# Altium footprint library mastermind.PCBLIB: 1061 footprints (part 9 of 67)
Each footprint in its own frame and in the unit in brackets; x right, y up, seen from the top. Pads: shape width x height; smd on the part's side, far side on the other; paste and mask are expansions set on the pad; w line width, h text height; cw(c..) or ccw(c..) is an arc to the next point about the centre after c.
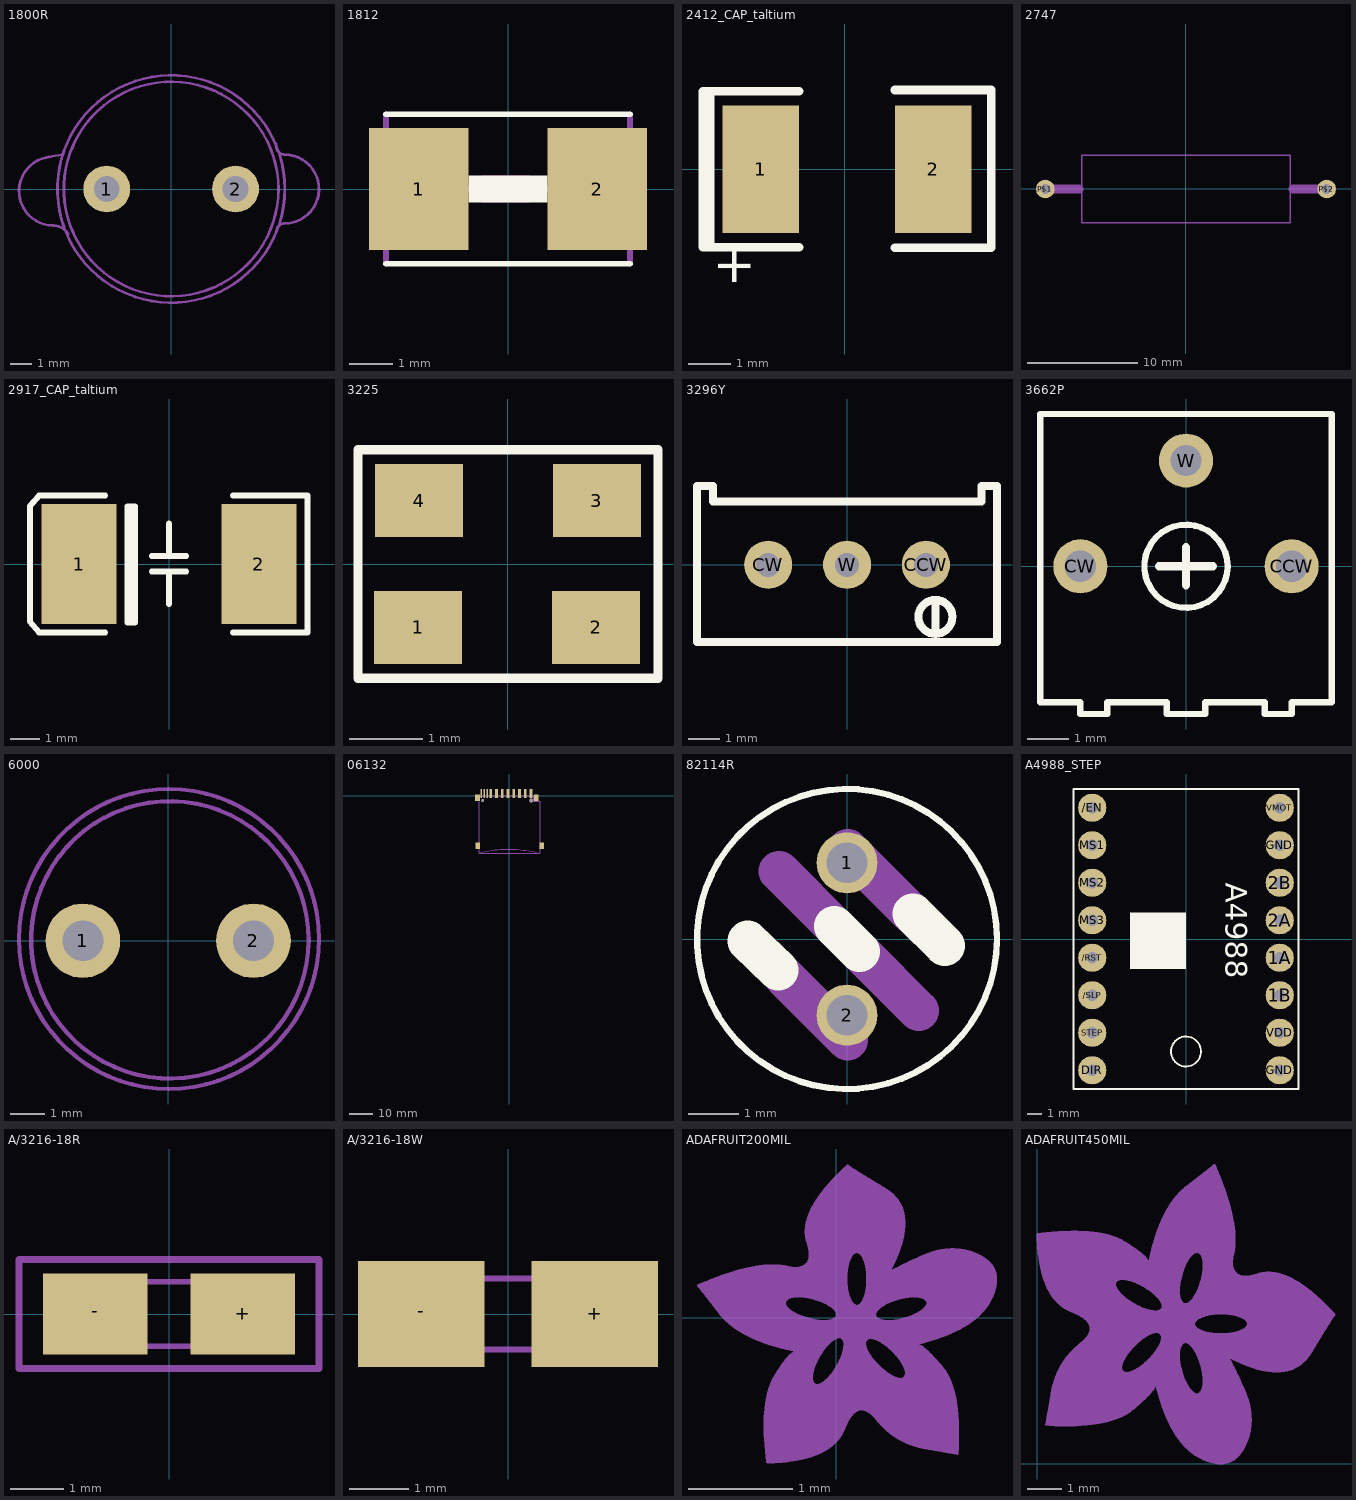
[diagram p8: the footprints below, top view; thin cyan lines are the x and y axes]

## 1800R [mil]
pads (2):
  round 86 hole 47.24: 1(-118.11,0) 2(118.11,0)
Mechanical 2:
  circle w5: c0,0 r196.85
  circle w5: c0,0 r208.66
  lines w5: -224.41,59.06 -200.79,62.99 ; -220.47,59.06 ccw(c-216.08,-3.86) -216.54,-66.93 cw(c-216.9,-99.55) -188.98,-82.68 ; 192.91,-78.74 cw(c208.66,-78.74) 208.66,-62.99 216.54,-62.99 ; 192.91,82.68 ccw(c208.78,79.23) 208.66,62.99 cw(c208.2,-0.08) 212.6,-62.99

## 1812 [mil]
pads (2):
  rect 90x110 smd: 1(-80.55,0) 2(80.55,0)
Top Overlay:
  region: -35.43,-11.81 -35.43,11.81 35.43,11.81 35.43,-11.81
  lines w5: -110.25,-67.37 110.25,-67.37 ; -110.25,67.37 110.25,67.37
Mechanical 2:
  region: -23.62,-11.81 -23.62,11.81 19.69,11.81 19.69,-11.81
Mechanical 8:
  lines w2.76: -62.99,-31.5 -62.99,31.5 ; 62.99,-31.5 62.99,31.5
  lines w5: -110.25,-67.37 -110.25,67.37 ; -90.55,0 94.49,0 ; -66.93,0 66.93,0 ; 110.25,-67.37 110.25,67.37

## 2412_CAP_taltium [mm]
pads (2):
  rect 1.8x3 smd: 1(-1.98,0) 2(2.08,0)
Top Overlay:
  region: -3.339,1.861 -3.339,-1.839 -3.079,-1.839 -3.079,1.861
  lines w0.203: -1.08,-1.829 -3.339,-1.829 -3.339,1.841 -1.08,1.841 ; 1.18,-1.841 3.443,-1.841 3.443,1.867 1.18,1.867
  text "+" at -2.22,-2.79 h0.89

## 2747 [mil]
pads (2):
  round 66 hole 35.43: P$1(-500,0) P$2(500,0)
Mechanical 2:
  lines w5: -370,-120 -370,120 370,120 370,-120 -370,-120
  lines w32: -490,0 -380,0 ; 380,0 490,0

## 2917_CAP_taltium [mil]
pads (2):
  rect 100x160 smd: 1(-120,0) 2(120,0)
Top Overlay:
  lines w7.87: -185.5,-76.85 -173.13,-91.5 -85,-91.5 ; -185.5,77 -173.13,91.5 -85,91.5 ; -55.5,-59.98 -55.5,77 -45.5,77 -45.5,71.5 -50.5,71.5 ; -55.5,-51.98 -55.5,-78 -45.5,-78 ; -23,-10 23,-10 ; -23,10.5 23,10.5 ; 0,-53.5 0,-10 ; 0,10.5 0,54
  lines w8: -185.5,-76.85 -185.5,77 ; -55.5,-76 -55.5,71 ; -52.2,-78 -45.5,-71.3 ; -52.2,-76.8 -52.2,76.8 ; -45.5,-78 -45.5,71.5 ; 85.5,-91.5 185,-91.5 185,91.5 85.5,91.5
3D body "tantalum 330uF.stp": height 110.28, standoff -3.94, extent -147.14,-84 148.14,85.29

## 3225 [mm]
pads (4):
  rect 1.2x1 smd: 1(-1.223,-0.867) 2(1.21,-0.867) 3(1.223,0.867) 4(-1.21,0.867)
Top Overlay:
  lines w0.127: -2.045,-1.562 -2.045,1.562 2.057,1.562 2.057,-1.562 -2.045,-1.562
3D body "3225-CRYSTAL.step": height 0.61, standoff 0, extent -1.6,-1.25 1.6,1.25

## 3296Y [mil] "Multi-Turn Potentiometer"
pads (3):
  round 60 hole 30: CCW(98.42,0) CW(-98.42,0) W(0,0)
Top Overlay:
  lines w10: -187.22,-96.46 -187.22,96.46 -187.22,98.43 -167.52,98.43 -167.52,78.74 167.52,78.74 167.52,98.43 187.01,98.43 187.01,96.46 187.01,-96.46 -187.01,-96.46 ; 109.99,-86.2 cw(c110.19,-64.99) 110.4,-86.2 ; 110.39,-50 110.39,-65 ; 110.39,-65 110.39,-80 110.39,-65
3D body "Trimpot_3296W.STEP": height 454.72, standoff -102.36, extent -187.6,-95.08 187.6,95.08

## 3662P [mm] "Single Turn/Trimming Potentiometer"
pads (3):
  round 1.3 hole 0.75: CCW(2.54,0) CW(-2.54,0) W(0,2.54)
Top Overlay:
  circle w0.152: c0,0 r1
  lines w0.152: -3.5,-3.271 -3.5,3.66 3.5,3.66 3.5,-3.271 2.54,-3.271 2.54,-3.551 1.89,-3.551 1.89,-3.271 0.46,-3.271 0.46,-3.551 -0.46,-3.551 -0.46,-3.271 -1.89,-3.271 -1.89,-3.551 -2.54,-3.551 -2.54,-3.271 -3.5,-3.271
  lines w0.2: -0.65,0 0,0 ; 0,-0.46 0,0 ; 0,0.46 0,0 ; 0.65,0 0,0
3D body "10K,  BOURNS 3362P-103LF.STEP": height 4.75, standoff -3.1, extent -3.33,-3.551 3.33,3.439

## 6000 [mil]
pads (2):
  round 86 hole 47.24: 1(-98.43,0) 2(98.43,0)
Mechanical 2:
  circle w5: c1,2 r173
  circle w5: c2,1 r160

## 06132 [mm]
pads (17):
  round 1.1 hole 1.1: 1(-11.6,-2.1)
  rect 1.2x4 smd: 1(6.9,0.9) 2(4.4,0.9) 3(1.9,0.9) 4(-0.6,0.9) 5(-3.1,0.9) 6(-5.6,0.9) 7(-8.1,0.9) 9(9.4,0.9)
  round 1.6 hole 1.6: 1(9.5,-2.1)
  rect 0.7x4 smd: 8(-9.7,0.9) CD(-11,0.9) WP(-12.2,0.9)
  rect 2x2.8 smd: GP(-13.8,-21.8) GP2(14.1,-21.8) GP3(11.7,-0.9) GP4(-13.9,-1)
Mechanical 2:
  lines w0.127: -12.3,-25.1 -12.4,-24.8 cw(c-0.615,-75.53) 12,-25 12.2,-25.1 ; -12.3,-25.1 -13.2,-25.1 -13.2,0 10.6,0 10.6,-2.5 13.2,-2.5 13.3,-25.1 12.2,-25.1 ; -12.3,-25.1 12.2,-25.1

## 82114R [mil]
pads (2):
  oval 47.99x48 hole 32: 1(0,60) 2(0,-60)
Top Overlay:
  circle w5: c0,0 r118.11
  lines w32: -78.15,-1.57 -54.13,-24.61 ; -10.16,10.16 9.84,-9.84 ; 51.98,19.74 76.98,-5.26
Mechanical 2:
  lines w32: -53.52,53.45 -8.52,8.45 ; -49.5,-29.5 0.5,-79.5 ; 0.5,70.5 50.5,20.5 ; 11.48,-11.55 56.48,-56.55
3D body "inductor_PCB.STEP": height 340.25, standoff -92.82, extent -174.36,-175.27 182.85,182.12

## A4988_STEP [mil]
pads (16):
  round 75 / inner round 60 / far side round 75 hole 31.5: 1A(250,-50) 1B(250,-150) 2A(250,50) 2B(250,150) /EN(-250,350) /RST(-250,-50) /SLP(-250,-150) DIR(-250,-350) GND(250,-350) GND(250,250) MS1(-250,250) MS2(-250,150) MS3(-250,50) STEP(-250,-250) VDD(250,-250) VMOT(250,350)
Top Overlay:
  circle w5: c0,-300 r40
  rectangle: -149.98,-80 0.02,70
  lines w5: -300,-400 300,-400 300,400 -300,400 -300,-400
  text "A4988" at 86.61,150 h98.43
3D body "A4988 RED.STEP": height 578.74, standoff -52.76, extent -300,-400 300,400
3D body "8-Pin Header - Female - 2.54mm.step": height 196.85, standoff -118.11, extent 202.85,-410.23 301.28,409.46
3D body "8-Pin Header - Female - 2.54mm.step": height 196.85, standoff -118.11, extent -299.21,-410.23 -200.79,409.46

## A/3216-18R [mm]
pads (2):
  rect 1.95x1.5 smd: +(1.375,0) -(-1.375,0)
Mechanical 8:
  region: 0.8,-0.625 0.8,0.625 1.1,0.625 1.1,-0.625
  region: 1.475,-0.6 1.475,0.6 1.6,0.6 1.6,-0.6
  region: -1.6,-0.6 -1.6,0.6 -1.475,0.6 -1.475,-0.6
  lines w0.102: -1.45,-0.6 -1.45,0.6 1.45,0.6 1.45,-0.6 -1.45,-0.6
Mechanical 29 (Mech34):
  lines w0.127: -2.794,-1.016 -2.794,1.016 2.794,1.016 2.794,-1.016 -2.794,-1.016

## A/3216-18W [mm]
pads (2):
  rect 2.15x1.8 smd: +(1.475,0) -(-1.475,0)
Mechanical 8:
  region: -1.6,-0.6 -1.6,0.6 -1.475,0.6 -1.475,-0.6
  region: 1.475,-0.6 1.475,0.6 1.6,0.6 1.6,-0.6
  region: 0.8,-0.625 0.8,0.625 1.1,0.625 1.1,-0.625
  lines w0.102: -1.45,-0.6 1.45,-0.6 1.45,0.6 -1.45,0.6 -1.45,-0.6

## ADAFRUIT200MIL [mm]
Mechanical 2:
  drawing of 2202 lines, arcs and shapes, not listed

## ADAFRUIT450MIL [mm]
Mechanical 2:
  drawing of 2202 lines, arcs and shapes, not listed